# Altium footprint library Connectors.PcbLib: 117 footprints (part 4 of 8)
Each footprint in its own frame and in the unit in brackets; x right, y up, seen from the top. Pads: shape width x height; smd on the part's side, far side on the other; paste and mask are expansions set on the pad; w line width, h text height; cw(c..) or ccw(c..) is an arc to the next point about the centre after c.
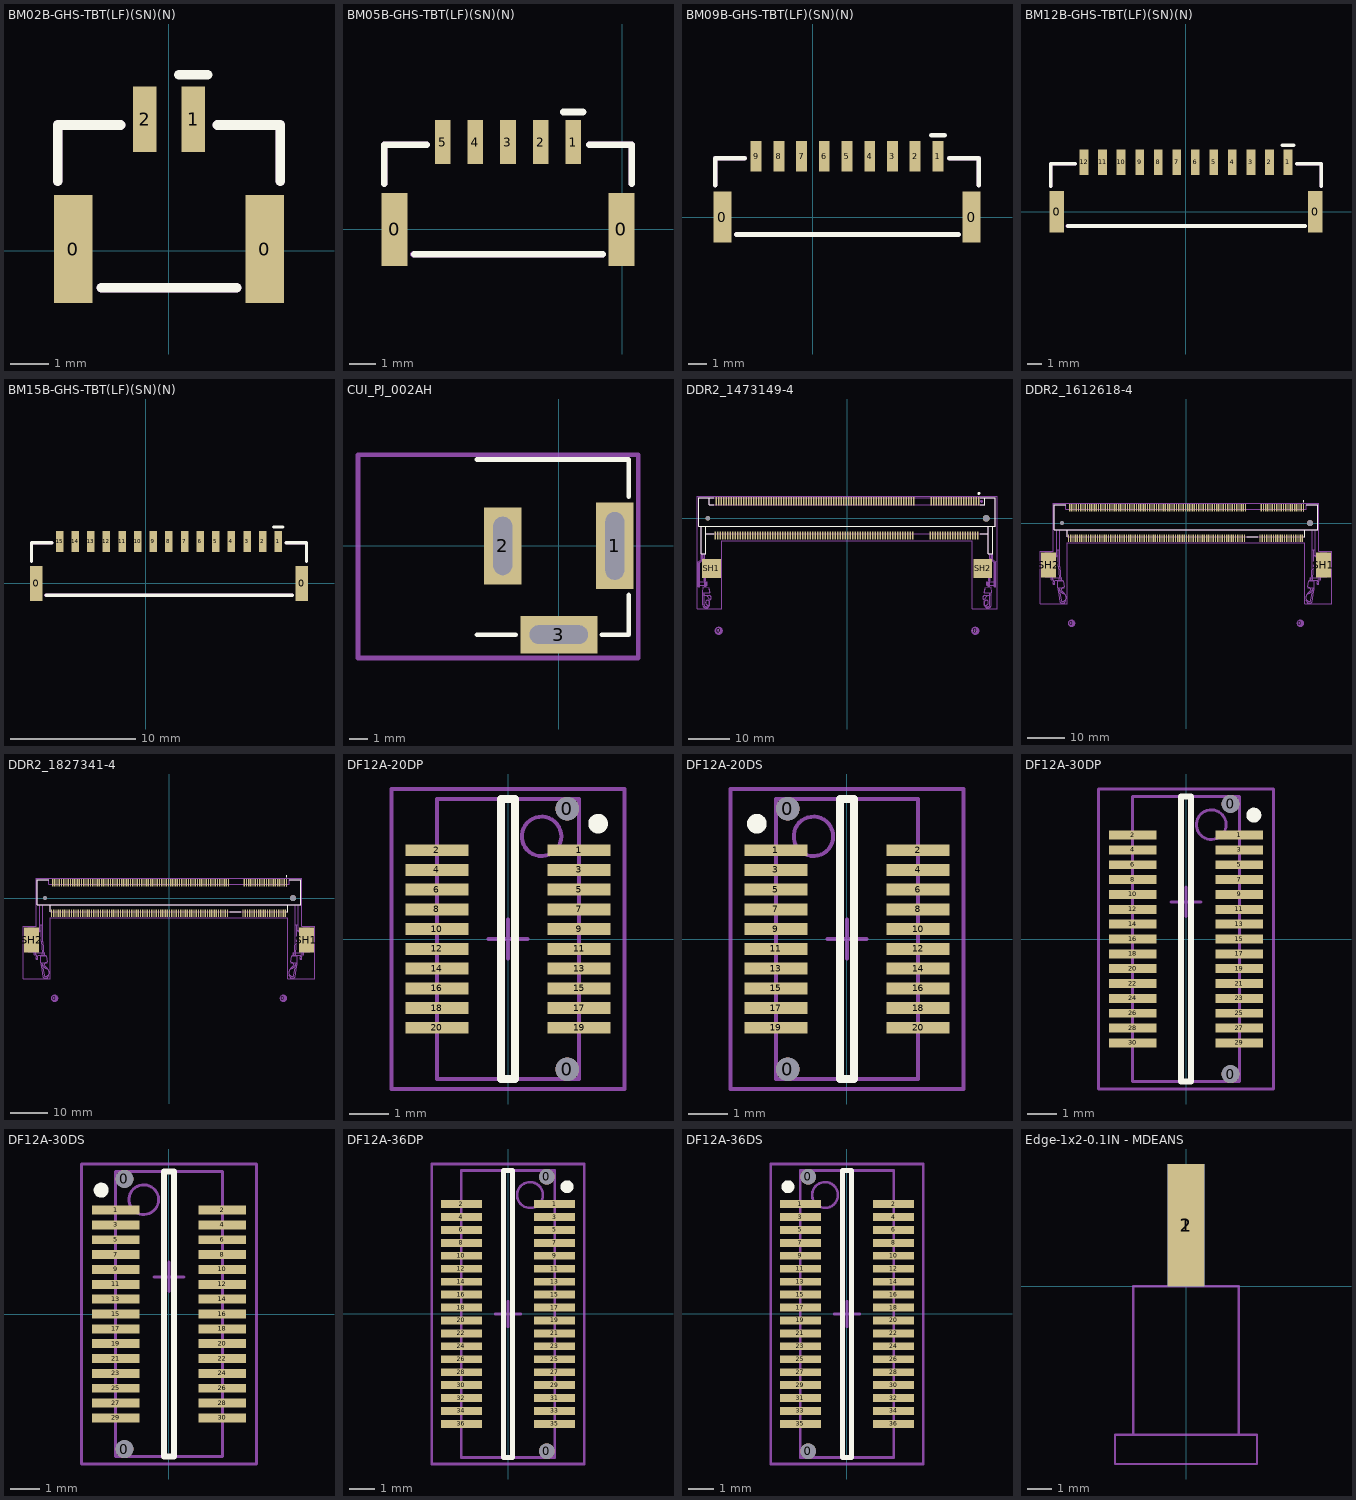
[diagram p3: the footprints below, top view; thin cyan lines are the x and y axes]

## BM02B-GHS-TBT(LF)(SN)(N) [mm] "CONN HEADER GH TOP 2POS 1.25MM"
height 7.3
pads (4):
  rect 1x2.8 smd: 0(-2.475,0.05) 0(2.475,0.05)
  rect 0.6x1.7 smd: 1(0.625,3.4) 2(-0.625,3.4)
Top Overlay:
  lines w0.254: -2.875,1.8 -2.875,3.25 -1.25,3.25 ; -1.75,-0.95 1.75,-0.95 ; 0.25,4.55 1,4.55 ; 1.25,3.25 2.875,3.25 2.875,1.8
Mechanical 13:
  lines w0.254: -2.875,3 -2.875,1.8 -2.875,3.25 -1.25,3.25 ; -1.75,-0.95 1.75,-0.95 ; 1.25,3.25 2.875,3.25 ; 2.875,1.8 2.875,3.25 ; 2.875,3.25 2.875,3 2.875,3.25
3D body "BM02B-GHS-TBT.STEP": height 4.18, standoff -0.03, extent -2.875,-0.95 2.875,4

## BM05B-GHS-TBT(LF)(SN)(N) [mm] "CONN HEADER GH TOP 5POS 1.25MM"
height 7.3
pads (7):
  rect 1x2.8 smd: 0(-8.725,0) 0(-0.025,0)
  rect 0.6x1.7 smd: 1(-1.875,3.35) 2(-3.125,3.35) 3(-4.375,3.35) 4(-5.625,3.35) 5(-6.875,3.35)
Top Overlay:
  lines w0.254: -9.125,1.75 -9.125,3.25 -7.5,3.25 ; -7.975,-0.95 -0.75,-0.95 ; -2.25,4.5 -1.5,4.5 ; -1.25,3.25 0.375,3.25 0.375,1.75
Mechanical 13:
  lines w0.254: -9.125,1.75 -9.125,3.25 -7.5,3.25 ; -8,-0.95 -0.75,-0.95 ; -1.25,3.25 0.375,3.25 0.375,1.75
3D body "BM05B-GHS-TBT.STEP": height 4.18, standoff -0.03, extent -9.125,-0.95 0.375,4

## BM09B-GHS-TBT(LF)(SN)(N) [mm] "CONN HEADER GH TOP 9POS 1.25MM"
height 7.3
pads (11):
  rect 1x2.8 smd: 0(-4.975,0) 0(8.725,0)
  rect 0.6x1.7 smd: 1(6.875,3.35) 2(5.625,3.35) 3(4.375,3.35) 4(3.125,3.35) 5(1.875,3.35) 6(0.625,3.35) 7(-0.625,3.35) 8(-1.875,3.35) 9(-3.125,3.35)
Top Overlay:
  lines w0.254: -5.375,1.75 -5.375,3.25 -3.75,3.25 ; -4.225,-0.95 8.025,-0.95 ; 6.5,4.5 7.25,4.5 ; 7.5,3.25 9.125,3.25 9.125,1.75
Mechanical 13:
  lines w0.254: -5.375,1.75 -5.375,3.25 -3.75,3.25 ; -4.225,-0.95 8,-0.95 ; 7.5,3.25 9.125,3.25 9.125,1.75
3D body "BM09B-GHS-TBT.STEP": height 4.18, standoff -0.03, extent -5.375,-0.95 9.125,4

## BM12B-GHS-TBT(LF)(SN)(N) [mm] "CONN HEADER GH TOP 12POS 1.25MM"
height 7.3
pads (14):
  rect 1x2.8 smd: 0(-8.725,0) 0(8.725,0)
  rect 0.6x1.7 smd: 1(6.875,3.35) 2(5.625,3.35) 3(4.375,3.35) 4(3.125,3.35) 5(1.875,3.35) 6(0.625,3.35) 7(-0.625,3.35) 8(-1.875,3.35) 9(-3.125,3.35) 10(-4.375,3.35) 11(-5.625,3.35) 12(-6.875,3.35)
Top Overlay:
  lines w0.254: -9.125,1.75 -9.125,3.25 -7.5,3.25 ; -7.975,-0.95 8.025,-0.95 ; 6.5,4.5 7.25,4.5 ; 7.5,3.25 9.125,3.25 9.125,1.75
Mechanical 13:
  lines w0.254: -9.125,1.75 -9.125,3.25 -7.5,3.25 ; -8,-0.95 8,-0.95 ; 7.5,3.25 9.125,3.25 9.125,1.75
3D body "BM12B-GHS-TBT.STEP": height 4.18, standoff -0.03, extent -9.125,-0.95 9.125,4

## BM15B-GHS-TBT(LF)(SN)(N) [mm] "CONN HEADER GH TOP 15POS 1.25MM"
height 7.3
pads (17):
  rect 1x2.8 smd: 0(-8.725,0) 0(12.475,0)
  rect 0.6x1.7 smd: 1(10.625,3.35) 2(9.375,3.35) 3(8.125,3.35) 4(6.875,3.35) 5(5.625,3.35) 6(4.375,3.35) 7(3.125,3.35) 8(1.875,3.35) 9(0.625,3.35) 10(-0.625,3.35) 11(-1.875,3.35) 12(-3.125,3.35) 13(-4.375,3.35) 14(-5.625,3.35) 15(-6.875,3.35)
Top Overlay:
  lines w0.254: -9.125,1.75 -9.125,3.25 -7.5,3.25 ; -7.975,-0.95 11.75,-0.95 ; 10.25,4.5 11,4.5 ; 11.25,3.25 12.875,3.25 12.875,1.75
Mechanical 13:
  lines w0.254: -9.125,1.75 -9.125,3.25 -7.5,3.25 ; -8,-0.95 11.75,-0.95 ; 11.25,3.25 12.875,3.25 12.875,1.75
3D body "BM15B-GHS-TBT.STEP": height 4.18, standoff -0.03, extent -9.125,-0.95 12.875,4

## CUI_PJ_002AH [mil] "DC Power Jack"
pads (3):
  rect 80x185 / inner rect 68x175 / far side rect 80x185 hole 40 slot 145 at 90 deg: 1(120,0)
  rect 80x165 / inner rect 68x155 / far side rect 80x165 hole 40 slot 125 at 90 deg: 2(-120,0)
  rect 165x80 / inner rect 155x68 / far side rect 165x80 hole 40 slot 125 at 0 deg: 3(0,-190)
Top Overlay:
  lines w10: -175,-190 -92,-190 ; -175,185 150,185 150,105 ; 92,-190 150,-190 150,-105
Mechanical 15:
  lines w10: -430,-240 170,-240 170,195 -430,195 -430,-240
3D body "PJ-002AH.stp": height 437.17, standoff -133.7, extent -422.93,-194.04 144,176.04

## DDR2_1473149-4 [mm] "DDR2 SODIMM Memory Socket"
pads (206):
  round 1.1 hole 1.1 unplated: 0(-33.4,0)
  round 2 on Mech15: 0(-30.8,-27) 0(30.8,-27)
  round 1.6 hole 1.6 unplated: 0(33.4,0)
  rect 0.35x2 smd: 1(31.65,4.1) 2(31.35,-4.1) 3(31.05,4.1) 4(30.75,-4.1) 5(30.45,4.1) 6(30.15,-4.1) 7(29.85,4.1) 8(29.55,-4.1) 9(29.25,4.1) 10(28.95,-4.1) 11(28.65,4.1) 12(28.35,-4.1) 13(28.05,4.1) 14(27.75,-4.1) 15(27.45,4.1) 16(27.15,-4.1) 17(26.85,4.1) 18(26.55,-4.1) 19(26.25,4.1) 20(25.95,-4.1) 21(25.65,4.1) 22(25.35,-4.1) 23(25.05,4.1) 24(24.75,-4.1) 25(24.45,4.1) 26(24.15,-4.1) 27(23.85,4.1) 28(23.55,-4.1) 29(23.25,4.1) 30(22.95,-4.1) 31(22.65,4.1) 32(22.35,-4.1) 33(22.05,4.1) 34(21.75,-4.1) 35(21.45,4.1) 36(21.15,-4.1) 37(20.85,4.1) 38(20.55,-4.1) 39(20.25,4.1) 40(19.95,-4.1) 41(16.05,4.1) 42(15.75,-4.1) 43(15.45,4.1) 44(15.15,-4.1) 45(14.85,4.1) 46(14.55,-4.1) 47(14.25,4.1) 48(13.95,-4.1) 49(13.65,4.1) 50(13.35,-4.1) 51(13.05,4.1) 52(12.75,-4.1) 53(12.45,4.1) 54(12.15,-4.1) 55(11.85,4.1) 56(11.55,-4.1) 57(11.25,4.1) 58(10.95,-4.1) 59(10.65,4.1) 60(10.35,-4.1) 61(10.05,4.1) 62(9.75,-4.1) 63(9.45,4.1) 64(9.15,-4.1) 65(8.85,4.1) 66(8.55,-4.1) 67(8.25,4.1) 68(7.95,-4.1) 69(7.65,4.1) 70(7.35,-4.1) 71(7.05,4.1) 72(6.75,-4.1) 73(6.45,4.1) 74(6.15,-4.1) 75(5.85,4.1) 76(5.55,-4.1) 77(5.25,4.1) 78(4.95,-4.1) 79(4.65,4.1) 80(4.35,-4.1) 81(4.05,4.1) 82(3.75,-4.1) 83(3.45,4.1) 84(3.15,-4.1) 85(2.85,4.1) 86(2.55,-4.1) 87(2.25,4.1) 88(1.95,-4.1) 89(1.65,4.1) 90(1.35,-4.1) 91(1.05,4.1) 92(0.75,-4.1) 93(0.45,4.1) 94(0.15,-4.1) 95(-0.15,4.1) 96(-0.45,-4.1) 97(-0.75,4.1) 98(-1.05,-4.1) 99(-1.35,4.1) 100(-1.65,-4.1) 101(-1.95,4.1) 102(-2.25,-4.1) 103(-2.55,4.1) 104(-2.85,-4.1) 105(-3.15,4.1) 106(-3.45,-4.1) 107(-3.75,4.1) 108(-4.05,-4.1) 109(-4.35,4.1) 110(-4.65,-4.1) 111(-4.95,4.1) 112(-5.25,-4.1) 113(-5.55,4.1) 114(-5.85,-4.1) 115(-6.15,4.1) 116(-6.45,-4.1) 117(-6.75,4.1) 118(-7.05,-4.1) 119(-7.35,4.1) 120(-7.65,-4.1) 121(-7.95,4.1) 122(-8.25,-4.1) 123(-8.55,4.1) 124(-8.85,-4.1) 125(-9.15,4.1) 126(-9.45,-4.1) 127(-9.75,4.1) 128(-10.05,-4.1) 129(-10.35,4.1) 130(-10.65,-4.1) 131(-10.95,4.1) 132(-11.25,-4.1) 133(-11.55,4.1) 134(-11.85,-4.1) 135(-12.15,4.1) 136(-12.45,-4.1) 137(-12.75,4.1) 138(-13.05,-4.1) 139(-13.35,4.1) 140(-13.65,-4.1) 141(-13.95,4.1) 142(-14.25,-4.1) 143(-14.55,4.1) 144(-14.85,-4.1) 145(-15.15,4.1) 146(-15.45,-4.1) 147(-15.75,4.1) 148(-16.05,-4.1) 149(-16.35,4.1) 150(-16.65,-4.1) 151(-16.95,4.1) 152(-17.25,-4.1) 153(-17.55,4.1) 154(-17.85,-4.1) 155(-18.15,4.1) 156(-18.45,-4.1) 157(-18.75,4.1) 158(-19.05,-4.1) 159(-19.35,4.1) 160(-19.65,-4.1) 161(-19.95,4.1) 162(-20.25,-4.1) 163(-20.55,4.1) 164(-20.85,-4.1) 165(-21.15,4.1) 166(-21.45,-4.1) 167(-21.75,4.1) 168(-22.05,-4.1) 169(-22.35,4.1) 170(-22.65,-4.1) 171(-22.95,4.1) 172(-23.25,-4.1) 173(-23.55,4.1) 174(-23.85,-4.1) 175(-24.15,4.1) 176(-24.45,-4.1) 177(-24.75,4.1) 178(-25.05,-4.1) 179(-25.35,4.1) 180(-25.65,-4.1) 181(-25.95,4.1) 182(-26.25,-4.1) 183(-26.55,4.1) 184(-26.85,-4.1) 185(-27.15,4.1) 186(-27.45,-4.1) 187(-27.75,4.1) 188(-28.05,-4.1) 189(-28.35,4.1) 190(-28.65,-4.1) 191(-28.95,4.1) 192(-29.25,-4.1) 193(-29.55,4.1) 194(-29.85,-4.1) 195(-30.15,4.1) 196(-30.45,-4.1) 197(-30.75,4.1) 198(-31.05,-4.1) 199(-31.35,4.1) 200(-31.65,-4.1)
  rect 4.5x4.6 smd: SH1(-32.55,-12) SH2(32.55,-12)
Top Overlay:
  circle w0.5: c31.65,6 r0.1
  lines w0.127: -33,5 -32,5 ; -32,-3.7 -33.95,-3.7 ; -32,3.27 -33.02,3.27 -33.02,5 -35.55,5 -35.55,-1.85 -35,-1.85 ; 32,-3.7 33.95,-3.7 ; 32,3.27 33.02,3.27 33.02,5 35.55,5 35.55,-1.85 35,-1.85 ; 32,5 33,5 ; -35,-1.85 -33.95,-1.85 ; -35,-1.85 -35,-8.45 -33.95,-8.45 -33.95,-3.7 ; -33.95,-3.7 -33.95,-1.85 ; -33.95,-1.85 33.95,-1.85 ; 33.95,-1.85 35,-1.85 ; 33.95,-1.85 33.95,-8.45 35,-8.45 35,-1.85
Mechanical 1:
  drawing of 220 lines, arcs and shapes, not listed
Mechanical 4:
  lines w0.05: -36,-21.75 -36,5.35 36,5.35 36,-21.75 30.05,-21.75 30.05,-5.35 -30.05,-5.35 -30.05,-21.75 -36,-21.75
3D body "Compute Module v1.step": height 4.9, standoff 2.3, extent -33.8,-31 33.8,0
3D body "c-1473149-4-k2-3d.stp": height 5.76, standoff -0.66, extent -35.75,-21.54 35.75,5

## DDR2_1612618-4 [mm]
pads (206):
  round 2 on Mech15: 0(-30.8,-27) 0(30.8,-27)
  rect 0.35x2 smd: 1(31.65,4.1) 2(31.35,-4.1) 3(31.05,4.1) 4(30.75,-4.1) 5(30.45,4.1) 6(30.15,-4.1) 7(29.85,4.1) 8(29.55,-4.1) 9(29.25,4.1) 10(28.95,-4.1) 11(28.65,4.1) 12(28.35,-4.1) 13(28.05,4.1) 14(27.75,-4.1) 15(27.45,4.1) 16(27.15,-4.1) 17(26.85,4.1) 18(26.55,-4.1) 19(26.25,4.1) 20(25.95,-4.1) 21(25.65,4.1) 22(25.35,-4.1) 23(25.05,4.1) 24(24.75,-4.1) 25(24.45,4.1) 26(24.15,-4.1) 27(23.85,4.1) 28(23.55,-4.1) 29(23.25,4.1) 30(22.95,-4.1) 31(22.65,4.1) 32(22.35,-4.1) 33(22.05,4.1) 34(21.75,-4.1) 35(21.45,4.1) 36(21.15,-4.1) 37(20.85,4.1) 38(20.55,-4.1) 39(20.25,4.1) 40(19.95,-4.1) 41(16.05,4.1) 42(15.75,-4.1) 43(15.45,4.1) 44(15.15,-4.1) 45(14.85,4.1) 46(14.55,-4.1) 47(14.25,4.1) 48(13.95,-4.1) 49(13.65,4.1) 50(13.35,-4.1) 51(13.05,4.1) 52(12.75,-4.1) 53(12.45,4.1) 54(12.15,-4.1) 55(11.85,4.1) 56(11.55,-4.1) 57(11.25,4.1) 58(10.95,-4.1) 59(10.65,4.1) 60(10.35,-4.1) 61(10.05,4.1) 62(9.75,-4.1) 63(9.45,4.1) 64(9.15,-4.1) 65(8.85,4.1) 66(8.55,-4.1) 67(8.25,4.1) 68(7.95,-4.1) 69(7.65,4.1) 70(7.35,-4.1) 71(7.05,4.1) 72(6.75,-4.1) 73(6.45,4.1) 74(6.15,-4.1) 75(5.85,4.1) 76(5.55,-4.1) 77(5.25,4.1) 78(4.95,-4.1) 79(4.65,4.1) 80(4.35,-4.1) 81(4.05,4.1) 82(3.75,-4.1) 83(3.45,4.1) 84(3.15,-4.1) 85(2.85,4.1) 86(2.55,-4.1) 87(2.25,4.1) 88(1.95,-4.1) 89(1.65,4.1) 90(1.35,-4.1) 91(1.05,4.1) 92(0.75,-4.1) 93(0.45,4.1) 94(0.15,-4.1) 95(-0.15,4.1) 96(-0.45,-4.1) 97(-0.75,4.1) 98(-1.05,-4.1) 99(-1.35,4.1) 100(-1.65,-4.1) 101(-1.95,4.1) 102(-2.25,-4.1) 103(-2.55,4.1) 104(-2.85,-4.1) 105(-3.15,4.1) 106(-3.45,-4.1) 107(-3.75,4.1) 108(-4.05,-4.1) 109(-4.35,4.1) 110(-4.65,-4.1) 111(-4.95,4.1) 112(-5.25,-4.1) 113(-5.55,4.1) 114(-5.85,-4.1) 115(-6.15,4.1) 116(-6.45,-4.1) 117(-6.75,4.1) 118(-7.05,-4.1) 119(-7.35,4.1) 120(-7.65,-4.1) 121(-7.95,4.1) 122(-8.25,-4.1) 123(-8.55,4.1) 124(-8.85,-4.1) 125(-9.15,4.1) 126(-9.45,-4.1) 127(-9.75,4.1) 128(-10.05,-4.1) 129(-10.35,4.1) 130(-10.65,-4.1) 131(-10.95,4.1) 132(-11.25,-4.1) 133(-11.55,4.1) 134(-11.85,-4.1) 135(-12.15,4.1) 136(-12.45,-4.1) 137(-12.75,4.1) 138(-13.05,-4.1) 139(-13.35,4.1) 140(-13.65,-4.1) 141(-13.95,4.1) 142(-14.25,-4.1) 143(-14.55,4.1) 144(-14.85,-4.1) 145(-15.15,4.1) 146(-15.45,-4.1) 147(-15.75,4.1) 148(-16.05,-4.1) 149(-16.35,4.1) 150(-16.65,-4.1) 151(-16.95,4.1) 152(-17.25,-4.1) 153(-17.55,4.1) 154(-17.85,-4.1) 155(-18.15,4.1) 156(-18.45,-4.1) 157(-18.75,4.1) 158(-19.05,-4.1) 159(-19.35,4.1) 160(-19.65,-4.1) 161(-19.95,4.1) 162(-20.25,-4.1) 163(-20.55,4.1) 164(-20.85,-4.1) 165(-21.15,4.1) 166(-21.45,-4.1) 167(-21.75,4.1) 168(-22.05,-4.1) 169(-22.35,4.1) 170(-22.65,-4.1) 171(-22.95,4.1) 172(-23.25,-4.1) 173(-23.55,4.1) 174(-23.85,-4.1) 175(-24.15,4.1) 176(-24.45,-4.1) 177(-24.75,4.1) 178(-25.05,-4.1) 179(-25.35,4.1) 180(-25.65,-4.1) 181(-25.95,4.1) 182(-26.25,-4.1) 183(-26.55,4.1) 184(-26.85,-4.1) 185(-27.15,4.1) 186(-27.45,-4.1) 187(-27.75,4.1) 188(-28.05,-4.1) 189(-28.35,4.1) 190(-28.65,-4.1) 191(-28.95,4.1) 192(-29.25,-4.1) 193(-29.55,4.1) 194(-29.85,-4.1) 195(-30.15,4.1) 196(-30.45,-4.1) 197(-30.75,4.1) 198(-31.05,-4.1) 199(-31.35,4.1) 200(-31.65,-4.1)
  round 1.1 hole 1.1 unplated: None(-33.4,0)
  round 1.6 hole 1.6 unplated: None(33.4,0)
  rect 4x6.8 smd: SH1(37,-11.3) SH2(-37,-11.3)
Top Overlay:
  circle w0.2: c31.65,5.85 r0.1
  lines w0.127: -32.4,5 -35.55,5 -35.55,-1.85 -32,-1.85 ; -32,-3.7 -32,-1.85 ; 16.35,-3.7 19.35,-3.7 ; 31.71,-3.7 32,-3.7 32,-1.85 ; 32.35,5 35.55,5 35.55,-1.85 32,-1.85 ; -32,-1.85 32,-1.85
Mechanical 1:
  circle w0.2: c31.646,3.325 r0.1
  lines w0.127: -36.3,-14.7 -34.1,-14.7 ; -35.85,-9.7 -35.85,-15.3 ; -35.846,-9.69 -34.418,-8.65 ; -34.85,-1.842 -34.85,-7.25 ; -34.488,-18.1 cw(c-34.45,-20.25) -32.3,-20.212 ; -34.402,-8.64 -34.402,-7.25 ; -34.4,-7.4 -34.4,-11.6 -34.1,-14.7 ; -33.957,-21.167 -34.6,-17.4 ; -33.956,-21.169 ccw(c-33.563,-21.1) -33.563,-21.5 -32.947,-21.5 ccw(c-32.947,-21.1) -32.591,-21.282 ; -33.95,-7.3 -33.95,-11.7 -33.7,-15.4 ; -33.95,-1.842 -33.95,-7.25 -34.402,-7.25 ; -33.661,-20.776 ccw(c-33.269,-20.7) -33.269,-21.1 -33.114,-21.1 ccw(c-33.114,-20.7) -32.783,-20.924 ; -33.662,-20.774 -34.3,-17.4 ; -33.067,-15.66 -32.758,-17.16 cw(c-32.954,-17.2) -32.954,-17.4 -34.3,-17.4 ; -33.067,-15.658 ccw(c-33.263,-15.7) -33.263,-15.5 -34.4,-15.5 ccw(c-34.4,-15.7) -34.6,-15.7 -34.6,-17.4 ; -32.781,-20.922 -32.7,-20.8 ; -32.589,-21.279 -32.4,-20.9 ; 32.3,-20.212 cw(c34.45,-20.25) 34.488,-18.1 ; 32.589,-21.279 32.4,-20.9 ; 32.591,-21.282 ccw(c32.947,-21.1) 32.947,-21.5 33.563,-21.5 ccw(c33.563,-21.1) 33.956,-21.169 ; 32.781,-20.922 32.7,-20.8 ; 32.783,-20.924 ccw(c33.114,-20.7) 33.114,-21.1 33.269,-21.1 ccw(c33.269,-20.7) 33.661,-20.776 ; 33.067,-15.66 32.758,-17.16 ccw(c32.954,-17.2) 32.954,-17.4 34.3,-17.4 ; 33.067,-15.658 cw(c33.263,-15.7) 33.263,-15.5 34.4,-15.5 cw(c34.4,-15.7) 34.6,-15.7 34.6,-17.4 ; 33.662,-20.774 34.3,-17.4 ; 33.7,-15.4 33.95,-11.7 33.95,-7.3 ; 33.95,-1.842 33.95,-7.25 34.402,-7.25 ; 33.957,-21.167 34.6,-17.4 ; 34.4,-7.4 34.4,-11.6 34.1,-14.7 ; 34.402,-8.64 34.402,-7.25 ; 34.418,-8.65 35.846,-9.69 ; 34.85,-1.842 34.85,-7.25 ; 35.85,-9.7 35.85,-15.3 ; 36.3,-14.7 34.1,-14.7 ; -36.35,-14.5 -36.35,-9.692 ; -36.35,-14.5 -37.95,-14.5 -37.95,-8 -36.35,-8 -36.35,-9.692 ; -36.35,-14.5 -36.35,-15.3 -35.85,-15.3 ; -36.35,-9.692 -34.85,-8.65 -34.85,-7.25 ; -35.85,-15.3 -35.6,-15.3 -35.6,-15.7 -35.8,-15.8 -35.8,-16.2 ; -35.8,-16.2 -35.8,-16.45 -35.4,-16.45 -35.4,-16.2 ; -35.8,-16.2 -35.4,-16.2 ; -35.4,-16.2 -35.4,-15.8 -35.2,-15.4 -34.1,-15.4 ; -34.85,-7.25 -34.402,-7.25 ; -34.6,-17.4 -34.3,-17.4 ; -34.1,-15.4 -34.1,-14.7 ; -34.1,-15.4 -33.5,-15.4 -33.5,-14.7 -34.1,-14.7 ; -32.7,-20.8 -32.4,-20.9 ; -32.7,-20.8 -32.4,-20.6 -32.4,-20.9 ; -32,-1.85 -35.55,-1.85 -35.55,5 -32.4,5 -32.4,3.7 32.35,3.7 32.35,5 35.55,5 35.55,-1.85 32,-1.85 ; -32,-1.85 32,-1.85 ; -32,-1.85 -32,-3.7 32,-3.7 32,-1.85 ; 32.4,-20.9 32.7,-20.8 ; 32.4,-20.9 32.4,-20.6 32.7,-20.8 ; 34.1,-15.4 35.2,-15.4 35.4,-15.8 35.4,-16.2 ; 34.1,-15.4 34.1,-14.7 ; 34.1,-15.4 33.5,-15.4 33.5,-14.7 34.1,-14.7 ; 34.3,-17.4 34.6,-17.4 ; 34.402,-7.25 34.85,-7.25 ; 34.85,-7.25 34.85,-8.65 36.35,-9.692 ; 35.4,-16.2 35.4,-16.45 35.8,-16.45 35.8,-16.2 ; 35.4,-16.2 35.8,-16.2 ; 35.8,-16.2 35.8,-15.8 35.6,-15.7 35.6,-15.3 35.85,-15.3 ; 35.85,-15.3 36.35,-15.3 36.35,-14.5 ; 36.35,-14.5 36.35,-9.692 ; 36.35,-14.5 37.95,-14.5 37.95,-8 36.35,-8 36.35,-9.692
  lines w0.254: -33.701,-18.205 ccw(c-33.1,-18.3) -33.195,-18.901 ; -33.7,-18.2 cw(c-32.9,-18.2) -32.9,-17.4 ; -33.206,-18.899 cw(c-33.4,-20) -32.299,-20.194 ; -32.4,-20.6 -32.3,-20.2 ; 32.299,-20.194 cw(c33.4,-20) 33.206,-18.899 ; 32.3,-20.2 32.4,-20.6 ; 32.9,-17.4 cw(c32.9,-18.2) 33.7,-18.2 ; 33.195,-18.901 ccw(c33.1,-18.3) 33.701,-18.205
Mechanical 4:
  lines w0.05: -39.25,-21.75 -32,-21.75 -32,-5.35 32,-5.35 32,-21.75 39.25,-21.75 39.25,-7.65 35.8,-7.65 35.8,5.35 -35.8,5.35 -35.8,-7.65 -39.25,-7.65 -39.25,-21.75
3D body "Compute Module v1.step": height 8.8, standoff 6.2, extent -33.8,-31 33.8,0
3D body "c-1612618-4-e2-3d.stp": height 9.48, standoff -0.65, extent -37.95,-21.8 37.95,4.756

## DDR2_1827341-4 [mm]
pads (206):
  round 2 on Mech15: 0(-30.8,-27) 0(30.8,-27)
  rect 0.35x2 smd: 1(31.65,4.1) 2(31.35,-4.1) 3(31.05,4.1) 4(30.75,-4.1) 5(30.45,4.1) 6(30.15,-4.1) 7(29.85,4.1) 8(29.55,-4.1) 9(29.25,4.1) 10(28.95,-4.1) 11(28.65,4.1) 12(28.35,-4.1) 13(28.05,4.1) 14(27.75,-4.1) 15(27.45,4.1) 16(27.15,-4.1) 17(26.85,4.1) 18(26.55,-4.1) 19(26.25,4.1) 20(25.95,-4.1) 21(25.65,4.1) 22(25.35,-4.1) 23(25.05,4.1) 24(24.75,-4.1) 25(24.45,4.1) 26(24.15,-4.1) 27(23.85,4.1) 28(23.55,-4.1) 29(23.25,4.1) 30(22.95,-4.1) 31(22.65,4.1) 32(22.35,-4.1) 33(22.05,4.1) 34(21.75,-4.1) 35(21.45,4.1) 36(21.15,-4.1) 37(20.85,4.1) 38(20.55,-4.1) 39(20.25,4.1) 40(19.95,-4.1) 41(16.05,4.1) 42(15.75,-4.1) 43(15.45,4.1) 44(15.15,-4.1) 45(14.85,4.1) 46(14.55,-4.1) 47(14.25,4.1) 48(13.95,-4.1) 49(13.65,4.1) 50(13.35,-4.1) 51(13.05,4.1) 52(12.75,-4.1) 53(12.45,4.1) 54(12.15,-4.1) 55(11.85,4.1) 56(11.55,-4.1) 57(11.25,4.1) 58(10.95,-4.1) 59(10.65,4.1) 60(10.35,-4.1) 61(10.05,4.1) 62(9.75,-4.1) 63(9.45,4.1) 64(9.15,-4.1) 65(8.85,4.1) 66(8.55,-4.1) 67(8.25,4.1) 68(7.95,-4.1) 69(7.65,4.1) 70(7.35,-4.1) 71(7.05,4.1) 72(6.75,-4.1) 73(6.45,4.1) 74(6.15,-4.1) 75(5.85,4.1) 76(5.55,-4.1) 77(5.25,4.1) 78(4.95,-4.1) 79(4.65,4.1) 80(4.35,-4.1) 81(4.05,4.1) 82(3.75,-4.1) 83(3.45,4.1) 84(3.15,-4.1) 85(2.85,4.1) 86(2.55,-4.1) 87(2.25,4.1) 88(1.95,-4.1) 89(1.65,4.1) 90(1.35,-4.1) 91(1.05,4.1) 92(0.75,-4.1) 93(0.45,4.1) 94(0.15,-4.1) 95(-0.15,4.1) 96(-0.45,-4.1) 97(-0.75,4.1) 98(-1.05,-4.1) 99(-1.35,4.1) 100(-1.65,-4.1) 101(-1.95,4.1) 102(-2.25,-4.1) 103(-2.55,4.1) 104(-2.85,-4.1) 105(-3.15,4.1) 106(-3.45,-4.1) 107(-3.75,4.1) 108(-4.05,-4.1) 109(-4.35,4.1) 110(-4.65,-4.1) 111(-4.95,4.1) 112(-5.25,-4.1) 113(-5.55,4.1) 114(-5.85,-4.1) 115(-6.15,4.1) 116(-6.45,-4.1) 117(-6.75,4.1) 118(-7.05,-4.1) 119(-7.35,4.1) 120(-7.65,-4.1) 121(-7.95,4.1) 122(-8.25,-4.1) 123(-8.55,4.1) 124(-8.85,-4.1) 125(-9.15,4.1) 126(-9.45,-4.1) 127(-9.75,4.1) 128(-10.05,-4.1) 129(-10.35,4.1) 130(-10.65,-4.1) 131(-10.95,4.1) 132(-11.25,-4.1) 133(-11.55,4.1) 134(-11.85,-4.1) 135(-12.15,4.1) 136(-12.45,-4.1) 137(-12.75,4.1) 138(-13.05,-4.1) 139(-13.35,4.1) 140(-13.65,-4.1) 141(-13.95,4.1) 142(-14.25,-4.1) 143(-14.55,4.1) 144(-14.85,-4.1) 145(-15.15,4.1) 146(-15.45,-4.1) 147(-15.75,4.1) 148(-16.05,-4.1) 149(-16.35,4.1) 150(-16.65,-4.1) 151(-16.95,4.1) 152(-17.25,-4.1) 153(-17.55,4.1) 154(-17.85,-4.1) 155(-18.15,4.1) 156(-18.45,-4.1) 157(-18.75,4.1) 158(-19.05,-4.1) 159(-19.35,4.1) 160(-19.65,-4.1) 161(-19.95,4.1) 162(-20.25,-4.1) 163(-20.55,4.1) 164(-20.85,-4.1) 165(-21.15,4.1) 166(-21.45,-4.1) 167(-21.75,4.1) 168(-22.05,-4.1) 169(-22.35,4.1) 170(-22.65,-4.1) 171(-22.95,4.1) 172(-23.25,-4.1) 173(-23.55,4.1) 174(-23.85,-4.1) 175(-24.15,4.1) 176(-24.45,-4.1) 177(-24.75,4.1) 178(-25.05,-4.1) 179(-25.35,4.1) 180(-25.65,-4.1) 181(-25.95,4.1) 182(-26.25,-4.1) 183(-26.55,4.1) 184(-26.85,-4.1) 185(-27.15,4.1) 186(-27.45,-4.1) 187(-27.75,4.1) 188(-28.05,-4.1) 189(-28.35,4.1) 190(-28.65,-4.1) 191(-28.95,4.1) 192(-29.25,-4.1) 193(-29.55,4.1) 194(-29.85,-4.1) 195(-30.15,4.1) 196(-30.45,-4.1) 197(-30.75,4.1) 198(-31.05,-4.1) 199(-31.35,4.1) 200(-31.65,-4.1)
  round 1.1 hole 1.1 unplated: None(-33.4,0)
  round 1.6 hole 1.6 unplated: None(33.4,0)
  rect 4x6.8 smd: SH1(37,-11.3) SH2(-37,-11.3)
Top Overlay:
  circle w0.2: c31.65,5.85 r0.1
  lines w0.127: -32.4,5 -35.55,5 -35.55,-1.85 -32,-1.85 ; -32,-3.7 -32,-1.85 ; 16.35,-3.7 19.35,-3.7 ; 31.71,-3.7 32,-3.7 32,-1.85 ; 32.35,5 35.55,5 35.55,-1.85 32,-1.85 ; -32,-1.85 32,-1.85
Mechanical 1:
  circle w0.2: c31.646,3.325 r0.1
  lines w0.127: -36.3,-14.7 -34.1,-14.7 ; -35.85,-9.7 -35.85,-15.3 ; -35.846,-9.69 -34.418,-8.65 ; -34.85,-1.842 -34.85,-7.25 ; -34.488,-18.1 cw(c-34.45,-20.25) -32.3,-20.212 ; -34.402,-8.64 -34.402,-7.25 ; -34.4,-7.4 -34.4,-11.6 -34.1,-14.7 ; -33.957,-21.167 -34.6,-17.4 ; -33.956,-21.169 ccw(c-33.563,-21.1) -33.563,-21.5 -32.947,-21.5 ccw(c-32.947,-21.1) -32.591,-21.282 ; -33.95,-7.3 -33.95,-11.7 -33.7,-15.4 ; -33.95,-1.842 -33.95,-7.25 -34.402,-7.25 ; -33.661,-20.776 ccw(c-33.269,-20.7) -33.269,-21.1 -33.114,-21.1 ccw(c-33.114,-20.7) -32.783,-20.924 ; -33.662,-20.774 -34.3,-17.4 ; -33.067,-15.66 -32.758,-17.16 cw(c-32.954,-17.2) -32.954,-17.4 -34.3,-17.4 ; -33.067,-15.658 ccw(c-33.263,-15.7) -33.263,-15.5 -34.4,-15.5 ccw(c-34.4,-15.7) -34.6,-15.7 -34.6,-17.4 ; -32.781,-20.922 -32.7,-20.8 ; -32.589,-21.279 -32.4,-20.9 ; 32.3,-20.212 cw(c34.45,-20.25) 34.488,-18.1 ; 32.589,-21.279 32.4,-20.9 ; 32.591,-21.282 ccw(c32.947,-21.1) 32.947,-21.5 33.563,-21.5 ccw(c33.563,-21.1) 33.956,-21.169 ; 32.781,-20.922 32.7,-20.8 ; 32.783,-20.924 ccw(c33.114,-20.7) 33.114,-21.1 33.269,-21.1 ccw(c33.269,-20.7) 33.661,-20.776 ; 33.067,-15.66 32.758,-17.16 ccw(c32.954,-17.2) 32.954,-17.4 34.3,-17.4 ; 33.067,-15.658 cw(c33.263,-15.7) 33.263,-15.5 34.4,-15.5 cw(c34.4,-15.7) 34.6,-15.7 34.6,-17.4 ; 33.662,-20.774 34.3,-17.4 ; 33.7,-15.4 33.95,-11.7 33.95,-7.3 ; 33.95,-1.842 33.95,-7.25 34.402,-7.25 ; 33.957,-21.167 34.6,-17.4 ; 34.4,-7.4 34.4,-11.6 34.1,-14.7 ; 34.402,-8.64 34.402,-7.25 ; 34.418,-8.65 35.846,-9.69 ; 34.85,-1.842 34.85,-7.25 ; 35.85,-9.7 35.85,-15.3 ; 36.3,-14.7 34.1,-14.7 ; -36.35,-14.5 -36.35,-15.3 -35.85,-15.3 ; -36.35,-14.5 -37.95,-14.5 -37.95,-8 -36.35,-8 -36.35,-9.692 ; -36.35,-14.5 -36.35,-9.692 ; -36.35,-9.692 -34.85,-8.65 -34.85,-7.25 ; -35.85,-15.3 -35.6,-15.3 -35.6,-15.7 -35.8,-15.8 -35.8,-16.2 ; -35.8,-16.2 -35.4,-16.2 ; -35.8,-16.2 -35.8,-16.45 -35.4,-16.45 -35.4,-16.2 ; -35.4,-16.2 -35.4,-15.8 -35.2,-15.4 -34.1,-15.4 ; -34.85,-7.25 -34.402,-7.25 ; -34.6,-17.4 -34.3,-17.4 ; -34.1,-15.4 -33.5,-15.4 -33.5,-14.7 -34.1,-14.7 ; -34.1,-15.4 -34.1,-14.7 ; -32.7,-20.8 -32.4,-20.6 -32.4,-20.9 ; -32.7,-20.8 -32.4,-20.9 ; -32,-1.85 -32,-3.7 32,-3.7 32,-1.85 ; -32,-1.85 32,-1.85 ; -32,-1.85 -35.55,-1.85 -35.55,5 -32.4,5 -32.4,3.7 32.35,3.7 32.35,5 35.55,5 35.55,-1.85 32,-1.85 ; 32.4,-20.9 32.4,-20.6 32.7,-20.8 ; 32.4,-20.9 32.7,-20.8 ; 34.1,-15.4 33.5,-15.4 33.5,-14.7 34.1,-14.7 ; 34.1,-15.4 34.1,-14.7 ; 34.1,-15.4 35.2,-15.4 35.4,-15.8 35.4,-16.2 ; 34.3,-17.4 34.6,-17.4 ; 34.402,-7.25 34.85,-7.25 ; 34.85,-7.25 34.85,-8.65 36.35,-9.692 ; 35.4,-16.2 35.8,-16.2 ; 35.4,-16.2 35.4,-16.45 35.8,-16.45 35.8,-16.2 ; 35.8,-16.2 35.8,-15.8 35.6,-15.7 35.6,-15.3 35.85,-15.3 ; 35.85,-15.3 36.35,-15.3 36.35,-14.5 ; 36.35,-14.5 37.95,-14.5 37.95,-8 36.35,-8 36.35,-9.692 ; 36.35,-14.5 36.35,-9.692
  lines w0.254: -33.701,-18.205 ccw(c-33.1,-18.3) -33.195,-18.901 ; -33.7,-18.2 cw(c-32.9,-18.2) -32.9,-17.4 ; -33.206,-18.899 cw(c-33.4,-20) -32.299,-20.194 ; -32.4,-20.6 -32.3,-20.2 ; 32.299,-20.194 cw(c33.4,-20) 33.206,-18.899 ; 32.3,-20.2 32.4,-20.6 ; 32.9,-17.4 cw(c32.9,-18.2) 33.7,-18.2 ; 33.195,-18.901 ccw(c33.1,-18.3) 33.701,-18.205
Mechanical 4:
  lines w0.05: -39.25,-21.75 -39.25,-7.65 -35.8,-7.65 -35.8,5.35 35.8,5.35 35.8,-7.65 39.25,-7.65 39.25,-21.75 32,-21.75 32,-5.35 -32,-5.35 -32,-21.75 -39.25,-21.75
3D body "Compute Module v1.step": height 7.6, standoff 5, extent -33.8,-31 33.8,0
3D body "c-1827341-4-g1-3d.stp": height 8.13, standoff -0.66, extent -37.945,-21.394 37.945,5.106

## DF12A-20DP [mm] "Hirose Header, 20-Leads , Body 7.1x3.6mm (max), Pitch 0.50mm"
height 2.2
pads (22):
  round 0.6 hole 0.6 unplated: 0(1.5,-3.3) 0(1.5,3.3)
  rect 1.6x0.3 smd: 1(1.8,2.25) 2(-1.8,2.25) 3(1.8,1.75) 4(-1.8,1.75) 5(1.8,1.25) 6(-1.8,1.25) 7(1.8,0.75) 8(-1.8,0.75) 9(1.8,0.25) 10(-1.8,0.25) 11(1.8,-0.25) 12(-1.8,-0.25) 13(1.8,-0.75) 14(-1.8,-0.75) 15(1.8,-1.25) 16(-1.8,-1.25) 17(1.8,-1.75) 18(-1.8,-1.75) 19(1.8,-2.25) 20(-1.8,-2.25)
Top Overlay:
  circle w0.25: c2.284,2.921 r0.125
  lines w0.2: -0.175,-3.55 -0.175,3.55 0.175,3.55 0.175,-3.55 -0.175,-3.55
Mechanical 13:
  circle w0.1: c0.85,2.6 r0.5
  lines w0.1: -1.8,-3.55 -1.8,3.55 1.8,3.55 1.8,-3.55 -1.8,-3.55
Mechanical 15:
  lines w0.1: -0.5,0 0.5,0 ; 0,-0.5 0,0.5 ; -2.95,-3.8 -2.95,3.8 2.95,3.8 2.95,-3.8 -2.95,-3.8
3D body "DF12D(5.0)-20DP-0.5V.stp": height 4.32, standoff -0.58, extent -2.314,-3.6 2.286,3.6

## DF12A-20DS [mm] "Hirose Receptacle, 20-Leads , Body 7.1x3.6mm (max), Pitch 0.50mm"
height 2.2
pads (22):
  round 0.6 hole 0.6 unplated: 0(-1.5,-3.3) 0(-1.5,3.3)
  rect 1.6x0.3 smd: 1(-1.8,2.25) 2(1.8,2.25) 3(-1.8,1.75) 4(1.8,1.75) 5(-1.8,1.25) 6(1.8,1.25) 7(-1.8,0.75) 8(1.8,0.75) 9(-1.8,0.25) 10(1.8,0.25) 11(-1.8,-0.25) 12(1.8,-0.25) 13(-1.8,-0.75) 14(1.8,-0.75) 15(-1.8,-1.25) 16(1.8,-1.25) 17(-1.8,-1.75) 18(1.8,-1.75) 19(-1.8,-2.25) 20(1.8,-2.25)
Top Overlay:
  circle w0.25: c-2.284,2.921 r0.125
  lines w0.2: -0.175,-3.55 -0.175,3.55 0.175,3.55 0.175,-3.55 -0.175,-3.55
Mechanical 13:
  circle w0.1: c-0.85,2.6 r0.5
  lines w0.1: -1.8,-3.55 -1.8,3.55 1.8,3.55 1.8,-3.55 -1.8,-3.55
Mechanical 15:
  lines w0.1: -0.5,0 0.5,0 ; 0,-0.5 0,0.5 ; -2.95,-3.8 -2.95,3.8 2.95,3.8 2.95,-3.8 -2.95,-3.8
3D body "DF12A(3.0)-20DS-0.5V.stp": height 2.22, standoff -0.58, extent -2.261,-3.55 2.339,3.55

## DF12A-30DP [mm] "Hirose Header, 30-Leads , Body 9.6x3.6mm (max), Pitch 0.50mm"
height 2.2
pads (32):
  round 0.6 hole 0.6 unplated: 0(1.5,-4.55) 0(1.5,4.55)
  rect 1.6x0.3 smd: 1(1.8,3.5) 2(-1.8,3.5) 3(1.8,3) 4(-1.8,3) 5(1.8,2.5) 6(-1.8,2.5) 7(1.8,2) 8(-1.8,2) 9(1.8,1.5) 10(-1.8,1.5) 11(1.8,1) 12(-1.8,1) 13(1.8,0.5) 14(-1.8,0.5) 15(1.8,0) 16(-1.8,0) 17(1.8,-0.5) 18(-1.8,-0.5) 19(1.8,-1) 20(-1.8,-1) 21(1.8,-1.5) 22(-1.8,-1.5) 23(1.8,-2) 24(-1.8,-2) 25(1.8,-2.5) 26(-1.8,-2.5) 27(1.8,-3) 28(-1.8,-3) 29(1.8,-3.5) 30(-1.8,-3.5)
Top Overlay:
  circle w0.25: c2.284,4.171 r0.125
  lines w0.2: -0.175,-4.8 -0.175,4.8 0.175,4.8 0.175,-4.8 -0.175,-4.8
Mechanical 13:
  circle w0.1: c0.85,3.85 r0.5
  lines w0.1: -1.8,-4.8 -1.8,4.8 1.8,4.8 1.8,-4.8 -1.8,-4.8
Mechanical 15:
  lines w0.1: -0.5,1.25 0.5,1.25 ; 0,0.75 0,1.75 ; -2.95,-5.05 -2.95,5.05 2.95,5.05 2.95,-5.05 -2.95,-5.05

## DF12A-30DS [mm] "Hirose Receptacle, 30-Leads , Body 9.6x3.6mm (max), Pitch 0.50mm"
height 2.2
pads (32):
  round 0.6 hole 0.6 unplated: 0(-1.5,-4.55) 0(-1.5,4.55)
  rect 1.6x0.3 smd: 1(-1.8,3.5) 2(1.8,3.5) 3(-1.8,3) 4(1.8,3) 5(-1.8,2.5) 6(1.8,2.5) 7(-1.8,2) 8(1.8,2) 9(-1.8,1.5) 10(1.8,1.5) 11(-1.8,1) 12(1.8,1) 13(-1.8,0.5) 14(1.8,0.5) 15(-1.8,0) 16(1.8,0) 17(-1.8,-0.5) 18(1.8,-0.5) 19(-1.8,-1) 20(1.8,-1) 21(-1.8,-1.5) 22(1.8,-1.5) 23(-1.8,-2) 24(1.8,-2) 25(-1.8,-2.5) 26(1.8,-2.5) 27(-1.8,-3) 28(1.8,-3) 29(-1.8,-3.5) 30(1.8,-3.5)
Top Overlay:
  circle w0.25: c-2.284,4.171 r0.125
  lines w0.2: -0.175,-4.8 -0.175,4.8 0.175,4.8 0.175,-4.8 -0.175,-4.8
Mechanical 13:
  circle w0.1: c-0.85,3.85 r0.5
  lines w0.1: -1.8,-4.8 -1.8,4.8 1.8,4.8 1.8,-4.8 -1.8,-4.8
Mechanical 15:
  lines w0.1: -0.5,1.25 0.5,1.25 ; 0,0.75 0,1.75 ; -2.95,-5.05 -2.95,5.05 2.95,5.05 2.95,-5.05 -2.95,-5.05

## DF12A-36DP [mm] "Hirose Header, 36-Leads , Body 11.1x3.6mm (max), Pitch 0.50mm"
height 2.2
pads (38):
  round 0.6 hole 0.6 unplated: 0(1.5,-5.3) 0(1.5,5.3)
  rect 1.6x0.3 smd: 1(1.8,4.25) 2(-1.8,4.25) 3(1.8,3.75) 4(-1.8,3.75) 5(1.8,3.25) 6(-1.8,3.25) 7(1.8,2.75) 8(-1.8,2.75) 9(1.8,2.25) 10(-1.8,2.25) 11(1.8,1.75) 12(-1.8,1.75) 13(1.8,1.25) 14(-1.8,1.25) 15(1.8,0.75) 16(-1.8,0.75) 17(1.8,0.25) 18(-1.8,0.25) 19(1.8,-0.25) 20(-1.8,-0.25) 21(1.8,-0.75) 22(-1.8,-0.75) 23(1.8,-1.25) 24(-1.8,-1.25) 25(1.8,-1.75) 26(-1.8,-1.75) 27(1.8,-2.25) 28(-1.8,-2.25) 29(1.8,-2.75) 30(-1.8,-2.75) 31(1.8,-3.25) 32(-1.8,-3.25) 33(1.8,-3.75) 34(-1.8,-3.75) 35(1.8,-4.25) 36(-1.8,-4.25)
Top Overlay:
  circle w0.25: c2.284,4.921 r0.125
  lines w0.2: -0.175,-5.55 -0.175,5.55 0.175,5.55 0.175,-5.55 -0.175,-5.55
Mechanical 13:
  circle w0.1: c0.85,4.6 r0.5
  lines w0.1: -1.8,-5.55 -1.8,5.55 1.8,5.55 1.8,-5.55 -1.8,-5.55
Mechanical 15:
  lines w0.1: -0.5,0 0.5,0 ; 0,-0.5 0,0.5 ; -2.95,-5.8 -2.95,5.8 2.95,5.8 2.95,-5.8 -2.95,-5.8
3D body "DF12D(5.0)-36DP-0.5V.stp": height 4.32, standoff -0.58, extent -2.3,-5.6 2.3,5.6

## DF12A-36DS [mm] "Hirose Receptacle, 36-Leads , Body 11.1x3.6mm (max), Pitch 0.50mm"
height 2.2
pads (38):
  round 0.6 hole 0.6 unplated: 0(-1.5,-5.3) 0(-1.5,5.3)
  rect 1.6x0.3 smd: 1(-1.8,4.25) 2(1.8,4.25) 3(-1.8,3.75) 4(1.8,3.75) 5(-1.8,3.25) 6(1.8,3.25) 7(-1.8,2.75) 8(1.8,2.75) 9(-1.8,2.25) 10(1.8,2.25) 11(-1.8,1.75) 12(1.8,1.75) 13(-1.8,1.25) 14(1.8,1.25) 15(-1.8,0.75) 16(1.8,0.75) 17(-1.8,0.25) 18(1.8,0.25) 19(-1.8,-0.25) 20(1.8,-0.25) 21(-1.8,-0.75) 22(1.8,-0.75) 23(-1.8,-1.25) 24(1.8,-1.25) 25(-1.8,-1.75) 26(1.8,-1.75) 27(-1.8,-2.25) 28(1.8,-2.25) 29(-1.8,-2.75) 30(1.8,-2.75) 31(-1.8,-3.25) 32(1.8,-3.25) 33(-1.8,-3.75) 34(1.8,-3.75) 35(-1.8,-4.25) 36(1.8,-4.25)
Top Overlay:
  circle w0.25: c-2.284,4.921 r0.125
  lines w0.2: -0.175,-5.55 0.175,-5.55 0.175,5.55 -0.175,5.55 -0.175,-5.55
Mechanical 13:
  circle w0.1: c-0.85,4.6 r0.5
  lines w0.1: -1.8,-5.55 1.8,-5.55 1.8,5.55 -1.8,5.55 -1.8,-5.55
Mechanical 15:
  lines w0.1: -0.5,0 0.5,0 ; 0,-0.5 0,0.5 ; -2.95,-5.8 2.95,-5.8 2.95,5.8 -2.95,5.8 -2.95,-5.8
3D body "DF12A(3.0)-36DS-0.5V.stp": height 2.22, standoff -0.58, extent -2.253,-5.552 2.347,5.548

## Edge-1x2-0.1IN - MDEANS [mm]
pads (2):
  rect 1.5x5 smd paste-0.762: 1(0,2.5)
  rect 1.5x5 smd far side paste-0.762: 2(0,2.5)
Mechanical 13:
  lines w0.1: -2.9,-7.25 2.9,-7.25 2.9,-6.05 -2.9,-6.05 -2.9,-7.25 ; -2.15,-6.05 2.15,-6.05 2.15,0 -2.15,0 -2.15,-6.05
3D body: height 0.64, standoff 0, extent -0.317,-6.331 0.317,4.589
3D body: height -1.91, standoff -2.54, extent -0.317,-6.331 0.317,4.589
3D body: height 2.05, standoff -3.55, extent -2.149,-6.049 2.149,-0.001
3D body: height 2.05, standoff -3.55, extent -2.899,-7.249 2.899,-6.051